# Altium footprint library Capacitors_Alu_Dip.PcbLib: 29 footprints (part 2 of 2)
Each footprint in its own frame and in the unit in brackets; x right, y up, seen from the top. Pads: shape width x height; smd on the part's side, far side on the other; paste and mask are expansions set on the pad; w line width, h text height; cw(c..) or ccw(c..) is an arc to the next point about the centre after c.
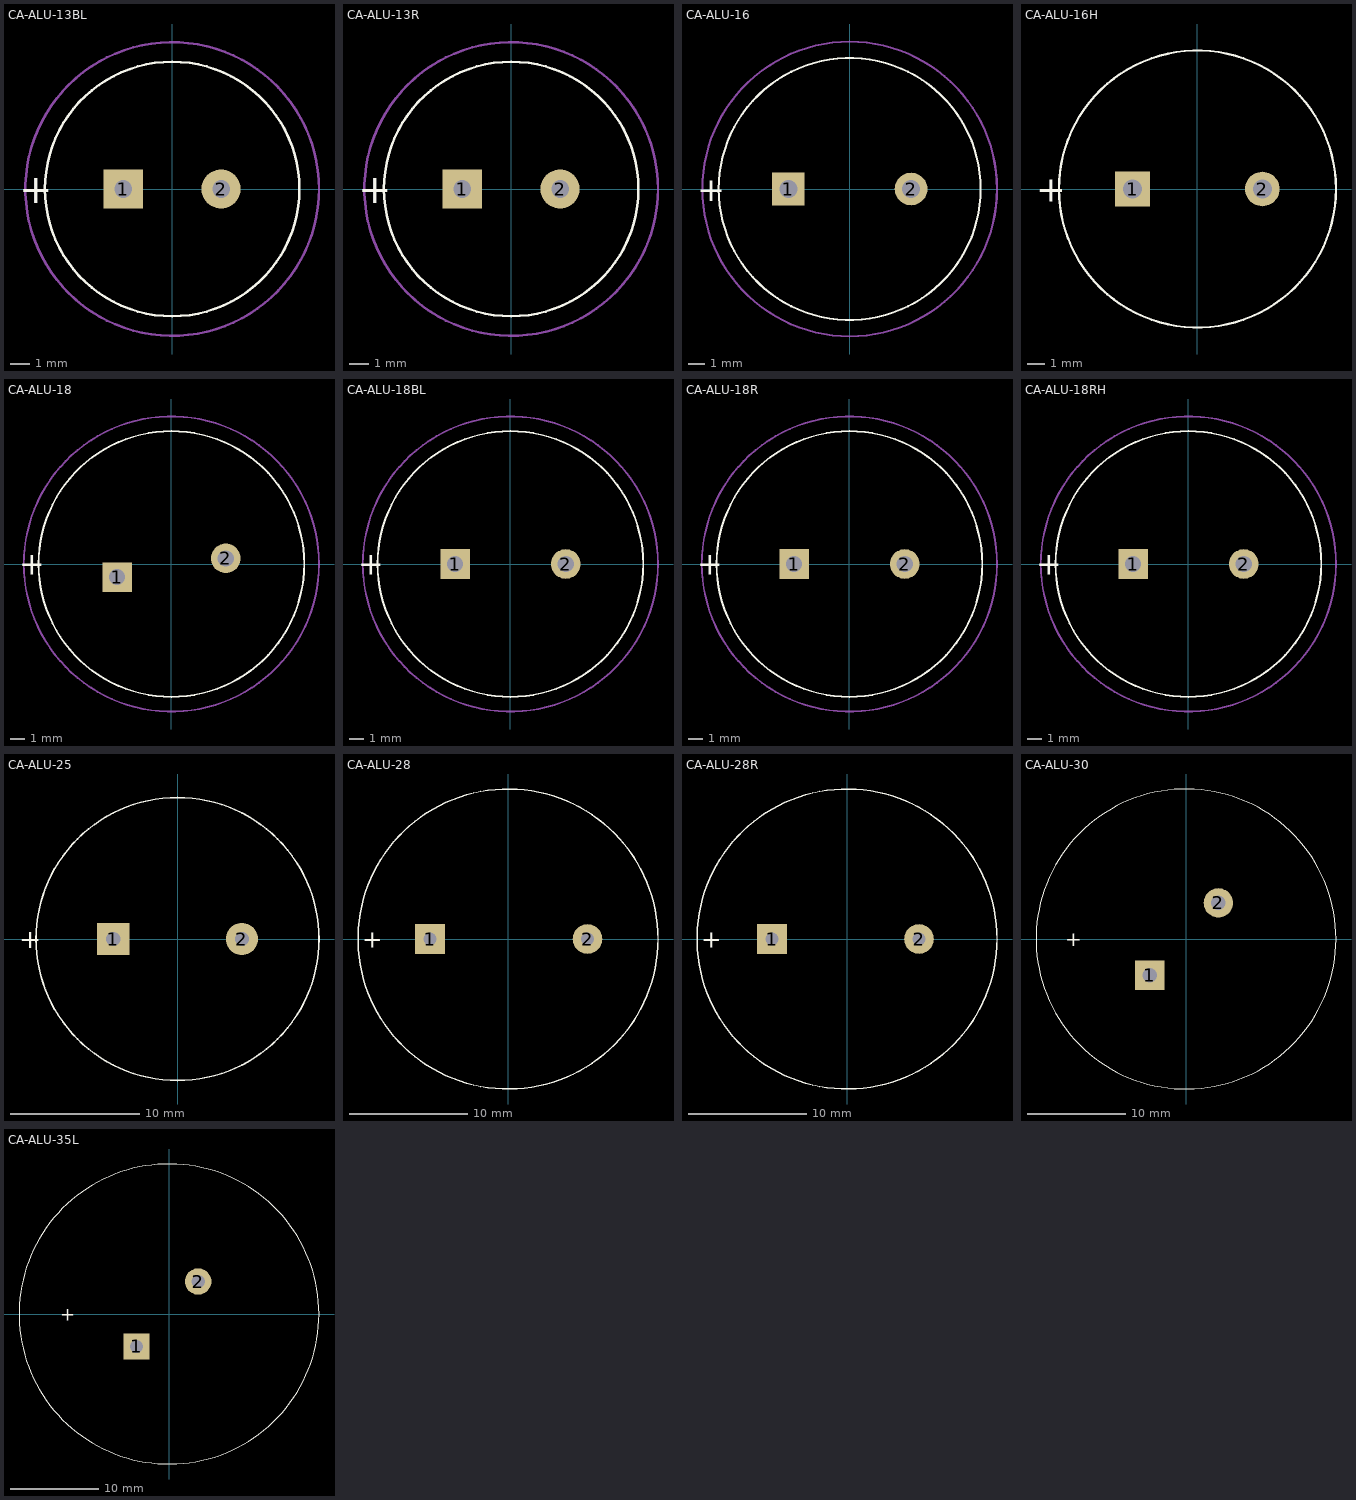
[diagram p1: the footprints below, top view; thin cyan lines are the x and y axes]

## CA-ALU-13BL [mm] "Polarized capacitors, Aluminum Electrolytic Capacitors, 2-Leads, Body 13x35x5x0.6"
height 35
pads (2):
  rect 2x2 hole 0.9: 1(-2.5,0)
  round 2 hole 0.9: 2(2.5,0)
Top Overlay:
  circle w0.127: c0,0 r6.5
  text "+" at -7.825,-0.737 h1.5
Mechanical 15:
  circle w0.127: c0,0 r7.5
3D body "13x25.step": height 25, standoff -3.3, extent -6.5,-6.499 6.502,6.499

## CA-ALU-13R [mm] "Polarized capacitors, Aluminum Electrolytic Capacitors, 2-Leads, Body 13x35x5x0.6"
height 35
pads (2):
  rect 2x2 hole 0.9: 1(-2.5,0)
  round 2 hole 0.9: 2(2.5,0)
Top Overlay:
  circle w0.127: c0,0 r6.5
  text "+" at -7.825,-0.737 h1.5
Mechanical 15:
  circle w0.127: c0,0 r7.5
3D body "13x35x5x0.6.stp": height 18.91, standoff -36.31, extent -6.5,-6.5 6.49,6.5

## CA-ALU-16 [mm] "Polarized capacitors, Aluminum Electrolytic Capacitors, 2-Leads, Body 16x21x7.5x0.8"
height 21
pads (2):
  rect 2x2 hole 1.1: 1(-3.75,0)
  round 2 hole 1.1: 2(3.75,0)
Top Overlay:
  circle w0.127: c0,0 r8
  text "+" at -9.325,-0.737 h1.5
Mechanical 15:
  circle w0.127: c0,0 r9
3D body "16x21x7.5x0.8.stp": height 21.31, standoff -19.91, extent -7.934,-7.957 7.99,8

## CA-ALU-16H [mm] "Polarized capacitors, Aluminum Electrolytic Capacitors, 2-Leads, Body 16x31.5x7.5x0.8"
height 31.5
pads (2):
  rect 2x2 hole 1.1: 1(-3.75,0)
  round 2 hole 1.1: 2(3.75,0)
Top Overlay:
  circle w0.127: c0,0 r8
  text "+" at -9.325,-0.737 h1.5
3D body "16x31.5x7.5x0.8.stp": height 19.11, standoff -32.61, extent -8,-7.998 7.99,7.998

## CA-ALU-18 [mm] "Polarized capacitors, Aluminum Electrolytic Capacitors, 2-Leads, Body 18x35.5x7.5x0.8"
height 35.5
pads (2):
  rect 2x2 hole 1.1: 1(-3.683,-0.889)
  round 2 / inner rect 2x2 / far side round 2 hole 1.1: 2(3.683,0.381)
Top Overlay:
  circle w0.127: c0,0 r9
  text "+" at -10.325,-0.737 h1.5
Mechanical 15:
  circle w0.127: c0,0 r10
3D body "18x35.step": height 35.45, standoff -3.2, extent -9,-9.252 9.05,8.745

## CA-ALU-18BL [mm] "Polarized capacitors, Aluminum Electrolytic Capacitors, 2-Leads, Body 18x35.5x7.5x0.8"
height 35.5
pads (2):
  rect 2x2 hole 1.1: 1(-3.75,0)
  round 2 / inner rect 2x2 / far side round 2 hole 1.1: 2(3.75,0)
Top Overlay:
  circle w0.127: c0,0 r9
  text "+" at -10.325,-0.737 h1.5
Mechanical 15:
  circle w0.127: c0,0 r10
3D body "18x16.step": height 16, standoff -2, extent -8.873,-8.873 9.127,9.127

## CA-ALU-18R [mm] "Polarized capacitors, Aluminum Electrolytic Capacitors, 2-Leads, Body 18x35.5x7.5x0.8"
height 35.5
pads (2):
  rect 2x2 hole 1.1: 1(-3.75,0)
  round 2 / inner rect 2x2 / far side round 2 hole 1.1: 2(3.75,0)
Top Overlay:
  circle w0.127: c0,0 r9
  text "+" at -10.325,-0.737 h1.5
Mechanical 15:
  circle w0.127: c0,0 r10
3D body "18x35.5x7.5x0.8.stp": height 18.91, standoff -36.81, extent -9,-8.997 8.99,8.997

## CA-ALU-18RH [mm] "Polarized capacitors, Aluminum Electrolytic Capacitors, 2-Leads, Body 18x35.5x7.5x0.8"
height 35.5
pads (2):
  rect 2x2 hole 1.1: 1(-3.75,0)
  round 2 / inner rect 2x2 / far side round 2 hole 1.1: 2(3.75,0)
Top Overlay:
  circle w0.127: c0,0 r9
  text "+" at -10.325,-0.737 h1.5
Mechanical 15:
  circle w0.127: c0,0 r10
3D body "18x40.step": height 41.36, standoff -2.78, extent -9.267,-9.138 9.013,9.138

## CA-ALU-25 [mm] "Polarized capacitors, Aluminum Electrolytic Capacitors, 2-Leads, Body 22x41x10x0.8"
height 41
pads (2):
  rect 2.5x2.5 / inner rrect50% 2.5x2.5 / far side rect 2.5x2.5 hole 1.1: 1(-5,0)
  round 2.5 / inner rrect50% 2.5x2.5 / far side round 2.5 hole 1.1: 2(5,0)
Top Overlay:
  circle w0.127: c0,0 r11
  text "+" at -12.325,-0.737 h1.5
3D body "22x41x10x0.8.stp": height 18.91, standoff -42.31, extent -11,-10.996 10.99,11

## CA-ALU-28 [mm] "Polarized capacitors, Aluminum Electrolytic Capacitors, 2-Leads, Body 22x41x10x0.8"
height 41
pads (2):
  rect 2.5x2.5 / inner rrect50% 2.5x2.5 / far side rect 2.5x2.5 hole 1.1: 1(-6.604,0)
  round 2.5 / inner rrect50% 2.5x2.5 / far side round 2.5 hole 1.1: 2(6.731,0)
Top Overlay:
  circle w0.127: c0,0 r12.7
  text "+" at -12.325,-0.737 h1.5
3D body "25x40.step": height 1.2, standoff -43.5, extent -12.7,-12.7 12.7,12.7

## CA-ALU-28R [mm] "Polarized capacitors, Aluminum Electrolytic Capacitors, 2-Leads, Body 22x41x10x0.8"
height 41
pads (2):
  rect 2.5x2.5 / inner rrect50% 2.5x2.5 / far side rect 2.5x2.5 hole 1.1: 1(-6.35,0)
  round 2.5 / inner rrect50% 2.5x2.5 / far side round 2.5 hole 1.1: 2(6.096,0)
Top Overlay:
  circle w0.127: c0,0 r12.7
  text "+" at -12.325,-0.737 h1.5
3D body "User Library-Cap 25x50.STEP": height 50, standoff -19, extent -12.627,-12.446 12.373,12.554

## CA-ALU-30 [mm] "Polarized capacitors, Aluminum Electrolytic Capacitors, 2-Leads, Body 22x41x10x0.8"
height 41
pads (2):
  rect 3x3 hole 1.5: 1(-3.683,-3.683)
  round 3 hole 1.5: 2(3.302,3.683)
Top Overlay:
  circle w0.127: c0,0 r15.3
  text "+" at -12.325,-0.737 h1.5
3D body "30x50.STEP": height 5.59, standoff -52.1, extent -21.806,-21.425 21.298,21.679

## CA-ALU-35L [mm] "Polarized capacitors, Aluminum Electrolytic Capacitors, 2-Leads, Body 22x41x10x0.8"
height 41
pads (2):
  rect 3x3 hole 1.5: 1(-3.683,-3.683)
  round 3 hole 1.5: 2(3.302,3.683)
Top Overlay:
  circle w0.127: c0,0 r17
  text "+" at -12.325,-0.737 h1.5
3D body "30x35.STEP": height 4.32, standoff -33.5, extent -24.89,-24.734 24.607,24.763